# Altium footprint library eLIB.PcbLib: 206 footprints (part 3 of 13)
Each footprint in its own frame and in the unit in brackets; x right, y up, seen from the top. Pads: shape width x height; smd on the part's side, far side on the other; paste and mask are expansions set on the pad; w line width, h text height; cw(c..) or ccw(c..) is an arc to the next point about the centre after c.
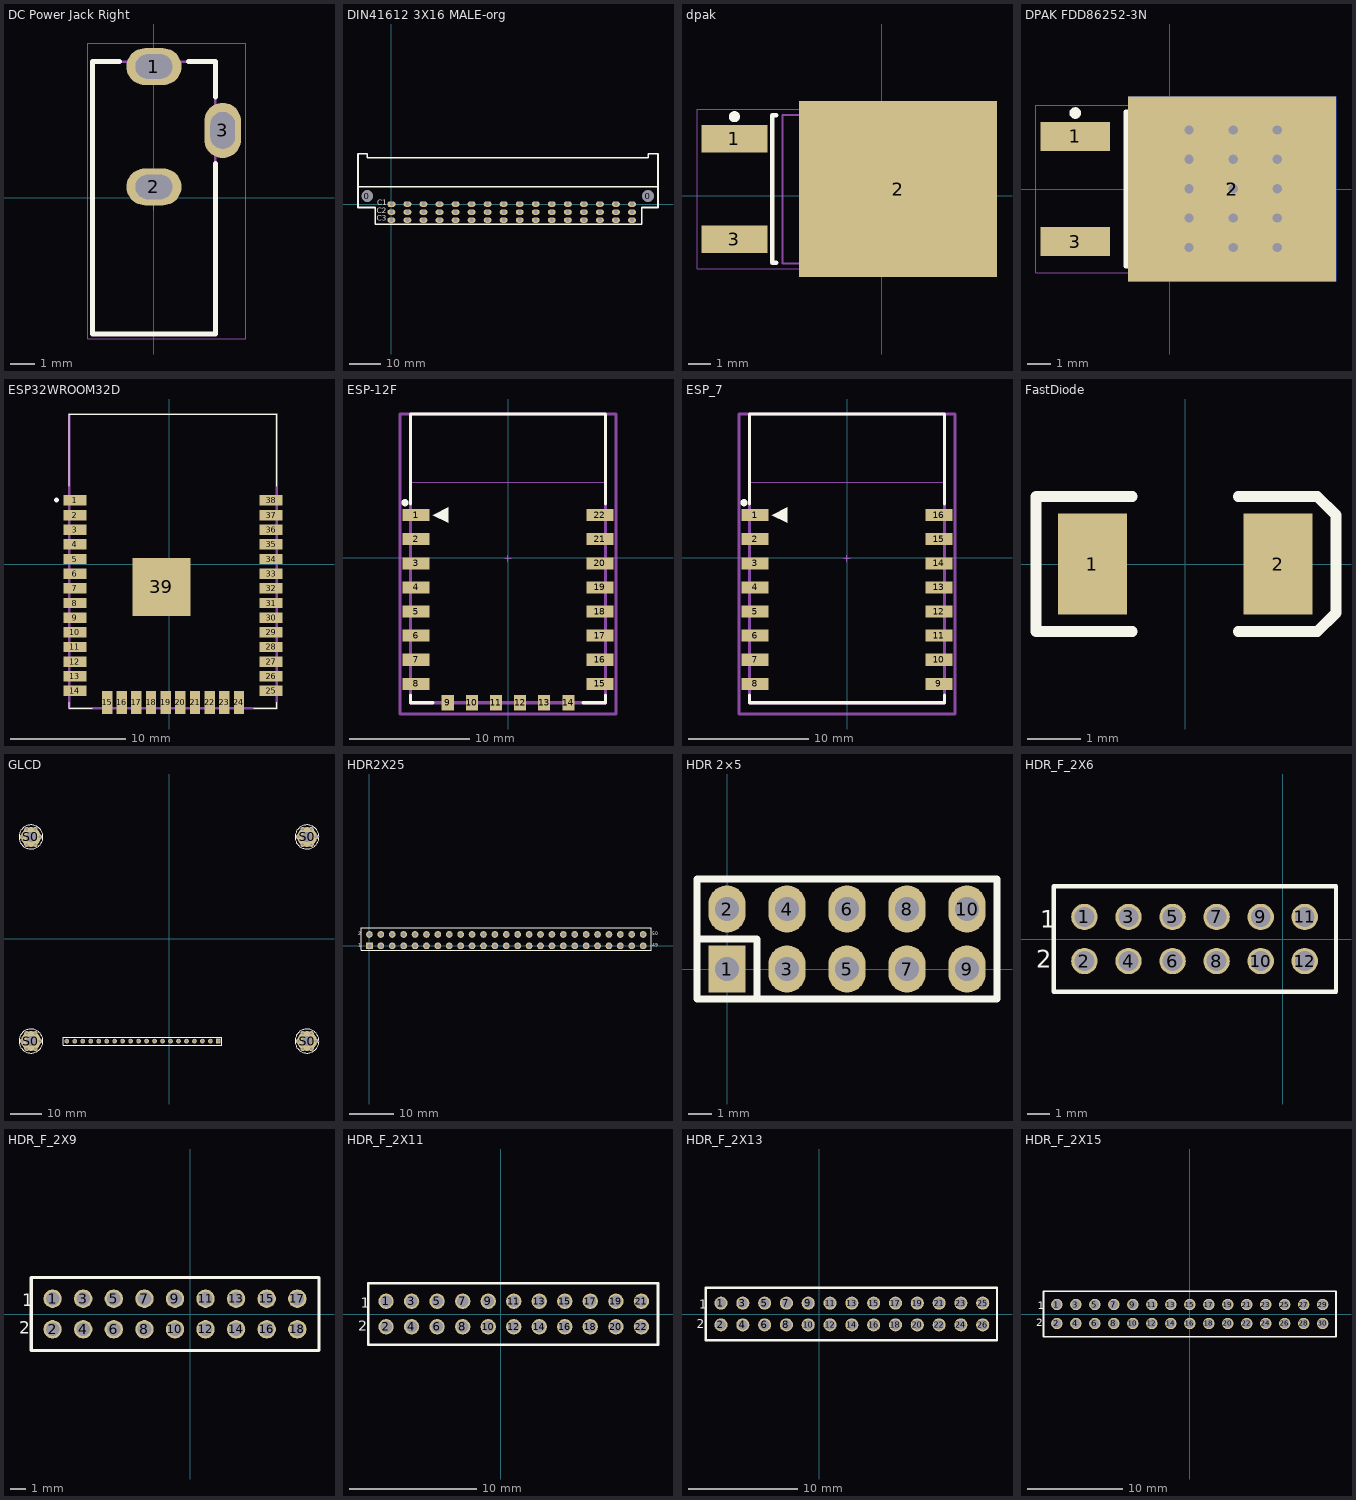
[diagram p2: the footprints below, top view; thin cyan lines are the x and y axes]

## DC Power Jack Right [mm] "DC Power Jack Right Angled(4.2), 694103303002"
height 7.4
pads (3):
  oval 2.25x1.5 hole 1 slot 1.5 at 0 deg: 1(0,5.35) 2(0,0.45)
  oval 1.5x2.25 hole 1 slot 1.5 at 90 deg: 3(2.8,2.75)
Top Overlay:
  lines w0.2: -1.4,5.55 -2.5,5.55 -2.5,-5.55 2.5,-5.55 2.5,1.4 ; 1.4,5.55 2.5,5.55 2.5,4.1
Mechanical 13:
  lines w0.1: -2.5,-5.55 2.5,-5.55 2.5,5.55 -2.5,5.55 -2.5,-5.55
Mechanical 15:
  lines w0.05: -0.5,0 0.5,0 ; 0,-0.5 0,0.5 ; -2.7,-5.75 -2.7,6.3 3.75,6.3 3.75,-5.75 -2.7,-5.75
3D body "694103303002.stp": height 7.8, standoff -2.6, extent -2.5,-5.55 3,5.75

## DIN41612 3X16 MALE-org [mm] "Connector  D032MS-3,0C1-10  9046326921"
height 0.88
pads (50):
  round 3.5 hole 3.7: 0(-7.62,2.54) 0(81.28,2.54)
  oct 2.5x1.7 hole 1.2: 1(0,0)
  oval 2.5x1.7 hole 1.2: 2(5.08,0) 3(10.16,0) 4(15.24,0) 5(20.32,0) 6(25.4,0) 7(30.48,0) 8(35.56,0) 9(40.64,0) 10(45.72,0) 11(50.8,0) 12(55.88,0) 13(60.96,0) 14(66.04,0) 15(71.12,0) 16(76.2,0) 17(0,-2.54) 18(5.08,-2.54) 19(10.16,-2.54) 20(15.24,-2.54) 21(20.32,-2.54) 22(25.4,-2.54) 23(30.48,-2.54) 24(35.56,-2.54) 25(40.64,-2.54) 26(45.72,-2.54) 27(50.8,-2.54) 28(55.88,-2.54) 29(60.96,-2.54) 30(66.04,-2.54) 31(71.12,-2.54) 32(76.2,-2.54) 33(0,-5.08) 34(5.08,-5.08) 35(10.16,-5.08) 36(15.24,-5.08) 37(20.32,-5.08) 38(25.4,-5.08) 39(30.48,-5.08) 40(35.56,-5.08) 41(40.64,-5.08) 42(45.72,-5.08) 43(50.8,-5.08) 44(55.88,-5.08) 45(60.96,-5.08) 46(66.04,-5.08) 47(71.12,-5.08) 48(76.2,-5.08)
Top Overlay:
  lines w0.508: -10.566,1.143 -10.566,15.92 ; -10.566,5.5 84.434,5.5 ; -0.813,-6.357 -5.105,-6.357 ; -0.305,-6.357 79.25,-6.357 79.25,-1.08 84.434,-1.08 84.434,15.92 81.407,15.92 81.407,14.656 -7.595,14.656 -7.595,15.9 -10.566,15.9 -10.566,-1.092 -5.105,-1.092 -5.105,-6.357 ; 0.025,-6.357 -5.105,-6.357 ; 84.434,1.143 84.434,8.643
  text "C3" at -4.572,-5.867 h3
  text "C2" at -4.572,-3.48 h3
  text "C1" at -4.496,-1.067 h3
3D body "DIN41612-C-48-M-RA-1-1.STP": height 11.2, standoff -3.5, extent -10.12,-5.76 83.78,16.24

## dpak [mm] "DPAK"
pads (3):
  rect 3x1.25 smd: 1(-6.7,2.58) 3(-6.7,-1.98)
  rect 9x8 smd: 2(0.737,0.305)
Top Overlay:
  circle w0.25: c-6.7,3.59 r0.125
  lines w0.2: -4.801,-3.048 -4.977,-3.048 -4.977,3.65 -4.801,3.65
Mechanical 13:
  lines w0.1: -4.52,-3.075 1.7,-3.075 1.7,3.675 -4.52,3.675 -4.52,-3.075
Mechanical 15:
  lines w0.05: 3.2,-3.325 -8.4,-3.325 -8.4,3.925 3.2,3.925 ; 3.43,-3.325 3.43,3.925
  lines w0.1: -2.87,0.3 -1.87,0.3 ; -2.37,-0.2 -2.37,0.8
3D body "DPAK228P991X239-3N.step": height 2.84, standoff 0, extent -6.74,-3.075 3.165,3.675

## DPAK FDD86252-3N [mm] "D-PAK, 3-Pads, Body 6.21x6.73mm (max), IPC Medium Density"
height 2.39
pads (4):
  rect 3x1.25 smd: 1(-4.1,2.28) 3(-4.1,-2.28)
  rect 9x8 smd: 2(2.69,0)
  rect 9x8 smd far side: 2(2.69,0)
via 0.83,2.557 diameter 0.8 hole 0.4
via 0.83,1.285 diameter 0.8 hole 0.4
via 0.83,0.012 diameter 0.8 hole 0.4
via 0.83,-1.26 diameter 0.8 hole 0.4
via 0.83,-2.532 diameter 0.8 hole 0.4
via 2.74,-2.532 diameter 0.8 hole 0.4
via 2.74,-1.26 diameter 0.8 hole 0.4
via 2.74,0.012 diameter 0.8 hole 0.4
via 2.74,1.285 diameter 0.8 hole 0.4
via 2.74,2.557 diameter 0.8 hole 0.4
via 4.65,-2.532 diameter 0.8 hole 0.4
via 4.65,-1.26 diameter 0.8 hole 0.4
via 4.65,0.012 diameter 0.8 hole 0.4
via 4.65,1.285 diameter 0.8 hole 0.4
via 4.65,2.557 diameter 0.8 hole 0.4
Top Overlay:
  circle w0.25: c-4.1,3.29 r0.125
  lines w0.2: -1.52,-3.35 -1.92,-3.35 -1.92,3.35 -1.52,3.35
Mechanical 13:
  lines w0.1: -1.92,-3.375 -1.92,3.375 4.3,3.375 4.3,-3.375 -1.92,-3.375
Mechanical 15:
  lines w0.05: 5.8,-3.625 -5.8,-3.625 -5.8,3.625 5.8,3.625 ; 6.03,-3.625 6.03,3.625
  lines w0.1: -0.27,0 0.73,0 ; 0.23,-0.5 0.23,0.5
3D body "DPAK228P991X239-3N.step": height 2.84, standoff 0, extent -4.14,-3.375 5.765,3.375

## ESP32WROOM32D [mm]
pads (39):
  rect 2x0.9 smd: 1(-8.15,5.51) 2(-8.15,4.24) 3(-8.15,2.97) 4(-8.15,1.7) 5(-8.15,0.43) 6(-8.15,-0.84) 7(-8.15,-2.11) 8(-8.15,-3.38) 9(-8.15,-4.65) 10(-8.15,-5.92) 11(-8.15,-7.19) 12(-8.15,-8.46) 13(-8.15,-9.73) 14(-8.15,-11) 25(8.85,-11) 26(8.85,-9.73) 27(8.85,-8.46) 28(8.85,-7.19) 29(8.85,-5.92) 30(8.85,-4.65) 31(8.85,-3.38) 32(8.85,-2.11) 33(8.85,-0.84) 34(8.85,0.43) 35(8.85,1.7) 36(8.85,2.97) 37(8.85,4.24) 38(8.85,5.51)
  rect 0.9x2 smd: 15(-5.365,-12) 16(-4.095,-12) 17(-2.825,-12) 18(-1.555,-12) 19(-0.285,-12) 20(0.985,-12) 21(2.255,-12) 22(3.525,-12) 23(4.795,-12) 24(6.065,-12)
  rect 5x5 smd: 39(-0.65,-1.99)
Top Overlay:
  lines w0.1: -8.65,-12 -8.65,-12.5 -6.65,-12.5 ; -8.65,6.75 -8.65,13 9.35,13 9.35,6.75 ; 7.35,-12.5 9.35,-12.5 9.35,-12
  lines w0.2: -9.75,5.45 ccw(c-9.75,5.55) -9.75,5.65 ccw(c-9.75,5.55) -9.75,5.45
Mechanical 13:
  lines w0.2: -8.65,-12.5 9.35,-12.5 9.35,13 -8.65,13 -8.65,-12.5
3D body "esp wroom 32nnn.STEP": height 3, standoff -0.04, extent -8.65,-12.57 9.42,12.97

## ESP-12F [mm] "ESP-12F WIFI MODULE"
height 3.2
pads (22):
  rect 2.25x1 smd: 1(-7.626,3.556) 2(-7.626,1.556) 3(-7.626,-0.444) 4(-7.626,-2.444) 5(-7.626,-4.444) 6(-7.626,-6.444) 7(-7.626,-8.444) 8(-7.626,-10.444) 15(7.624,-10.444) 16(7.624,-8.444) 17(7.624,-6.444) 18(7.624,-4.444) 19(7.624,-2.444) 20(7.624,-0.444) 21(7.624,1.556) 22(7.624,3.556)
  rect 1x1.25 smd: 9(-5,-12.01) 10(-3,-12.01) 11(-1,-12.01) 12(1,-12.01) 13(3,-12.01) 14(5,-12.01)
Top Layer:
  lines w0.254: -8.083,-12.012 -8.083,-11.36 ; 8.083,-12.012 8.083,-11.36
Top Overlay:
  circle w0.3: c-8.551,4.581 r0.15
  region: -6.231,3.556 -4.961,2.921 -4.961,4.191
  lines w0.254: -8.085,4.472 -8.085,11.927 8.083,11.927 8.083,4.472 ; -6.22,-12.012 -8.083,-12.012 ; 6.22,-12.012 8.083,-12.012 ; -8.083,-12.012 -8.083,-11.36 -8.083,-12.012 ; 8.083,-12.012 8.083,-11.36 8.083,-12.012
Mechanical 13:
  lines w0.051: -8.128,6.283 -8.128,11.938 8.128,11.938 8.128,6.283 -8.128,6.283
  lines w0.254: -8.085,-12.012 8.083,-12.012 8.083,11.927 -8.085,11.927 -8.085,-12.012
Mechanical 15:
  lines w0.1: -0.255,-0.042 0.253,-0.042 ; -0.001,-0.296 -0.001,0.212
  lines w0.254: -8.976,-12.944 -8.976,11.927 8.974,11.927 8.974,-12.944 -8.976,-12.944
3D body "ESP_12_E.STEP": height 2.75, standoff 0.04, extent -8,-11.935 8,12.065

## ESP_7 [mm] "ESP_7"
height 3.2
pads (16):
  rect 2.25x1 smd: 1(-7.626,3.556) 2(-7.626,1.556) 3(-7.626,-0.444) 4(-7.626,-2.444) 5(-7.626,-4.444) 6(-7.626,-6.444) 7(-7.626,-8.444) 8(-7.626,-10.444) 9(7.624,-10.444) 10(7.624,-8.444) 11(7.624,-6.444) 12(7.624,-4.444) 13(7.624,-2.444) 14(7.624,-0.444) 15(7.624,1.556) 16(7.624,3.556)
Top Overlay:
  circle w0.3: c-8.551,4.581 r0.15
  region: -6.231,3.556 -4.961,2.921 -4.961,4.191
  lines w0.254: -8.085,-11.36 -8.085,-12.012 8.083,-12.012 8.083,-11.36 ; -8.085,4.472 -8.085,11.927 8.083,11.927 8.083,4.472
Mechanical 13:
  lines w0.051: -8.128,6.283 -8.128,11.938 8.128,11.938 8.128,6.283 -8.128,6.283
  lines w0.254: -8.085,-12.012 8.083,-12.012 8.083,11.927 -8.085,11.927 -8.085,-12.012
Mechanical 15:
  lines w0.1: -0.255,-0.042 0.253,-0.042 ; -0.001,-0.296 -0.001,0.212
  lines w0.254: -8.976,-12.944 -8.976,11.927 8.974,11.927 8.974,-12.944 -8.976,-12.944
3D body "ESP_12_E.STEP": height 2.75, standoff 0.04, extent -8,-11.935 8,12.065

## FastDiode [mm]
pads (2):
  rect 1.3x1.9 smd: 1(-1.745,0) 2(1.745,0)
Top Overlay:
  lines w0.2: -0.997,-1.27 -2.805,-1.27 -2.805,1.27 -0.997,1.27 ; 0.997,-1.27 2.485,-1.27 2.835,-0.92 2.835,0.92 2.485,1.27 0.997,1.27
3D body "User Library-SOD123-1.STEP": height 1.18, standoff 0, extent -1.957,-0.913 1.943,0.887

## GLCD [mil]
pads (48):
  rect 59.06x59.06 hole 39.37: 1(619,-1279.76)
  round 59.06 hole 39.37: 2(519,-1279.76) 3(419,-1279.76) 4(319,-1279.76) 5(219,-1279.76) 6(119,-1279.76) 7(19,-1279.76) 8(-81,-1279.76) 9(-181,-1279.76) 10(-281,-1279.76) 11(-381,-1279.76) 12(-481,-1279.76) 13(-581,-1279.76) 14(-681,-1279.76) 15(-781,-1279.76) 16(-881,-1279.76) 17(-981,-1279.76) 18(-1081,-1279.76) 19(-1181,-1279.76) 20(-1281,-1279.76)
  round 250 hole 125.98: S0(-1730.32,-1279.53) S0(-1730.32,1279.53) S0(1730.32,-1279.53) S0(1730.32,1279.53)
  round 60 hole 30: S1(-1785.32,-1184.26) S1(-1785.32,1374.79) S1(1675.32,-1184.26) S1(1675.32,1374.79) S2(-1675.32,-1184.26) S2(-1675.32,1374.79) S2(1785.32,-1184.26) S2(1785.32,1374.79) S3(-1620.32,-1279.53) S3(-1620.32,1279.53) S3(1840.32,-1279.53) S3(1840.32,1279.53) S4(-1675.32,-1374.79) S4(-1675.32,1184.26) S4(1785.32,-1374.79) S4(1785.32,1184.26) S5(-1785.32,-1374.79) S5(-1785.32,1184.26) S5(1675.32,-1374.79) S5(1675.32,1184.26) S6(-1840.32,-1279.53) S6(-1840.32,1279.53) S6(1620.32,-1279.53) S6(1620.32,1279.53)
Top Overlay:
  circle w5: c1730.31,1279.53 r150
  circle w5: c1730.31,-1279.53 r150
  circle w5: c-1730.32,-1279.53 r150
  circle w5: c-1730.32,1279.53 r150
  lines w7.87: -1326.32,-1329.76 -1326.32,-1229.76 662.19,-1229.76 662.19,-1329.76 -1326.32,-1329.76
3D body "User Library-GLCD128x64(KS0108).STEP": height 968.5, standoff 472.44, extent -1832.18,-1378.19 1829.23,1377.71

## HDR2X25 [mm] "Connector; Header; 25x2 Position"
pads (50):
  rect 1.5x1.5 hole 0.9: 1(0,0)
  round 1.5 hole 0.9: 2(0,2.54) 3(2.54,0) 4(2.54,2.54) 5(5.08,0) 6(5.08,2.54) 7(7.62,0) 8(7.62,2.54) 9(10.16,0) 10(10.16,2.54) 11(12.7,0) 12(12.7,2.54) 13(15.24,0) 14(15.24,2.54) 15(17.78,0) 16(17.78,2.54) 17(20.32,0) 18(20.32,2.54) 19(22.86,0) 20(22.86,2.54) 21(25.4,0) 22(25.4,2.54) 23(27.94,0) 24(27.94,2.54) 25(30.48,0) 26(30.48,2.54) 27(33.02,0) 28(33.02,2.54) 29(35.56,0) 30(35.56,2.54) 31(38.1,0) 32(38.1,2.54) 33(40.64,0) 34(40.64,2.54) 35(43.18,0) 36(43.18,2.54) 37(45.72,0) 38(45.72,2.54) 39(48.26,0) 40(48.26,2.54) 41(50.8,0) 42(50.8,2.54) 43(53.34,0) 44(53.34,2.54) 45(55.88,0) 46(55.88,2.54) 47(58.42,0) 48(58.42,2.54) 49(60.96,0) 50(60.96,2.54)
Top Overlay:
  lines w0.2: -1.778,-1.016 -1.778,4.064 62.738,4.064 62.738,-1.016 -1.778,-1.016
  text "2" at -2.54,2.032 h1.27
  text "1" at -2.54,-0.508 h1.27
  text "49" at 62.992,-0.508 h1.27
  text "50" at 62.992,2.032 h1.27
3D body "female_header_a-bl200-dg-g20d.stp": height 4, standoff -2.8, extent 41.83,-0.72 62.33,3.78
3D body "female_header_a-bl200-dg-g20d.stp": height 4, standoff -2.8, extent 36.75,-0.72 57.25,3.78
3D body "female_header_a-bl200-dg-g20d.stp": height 4, standoff -2.8, extent 16.43,-0.72 36.93,3.78
3D body "female_header_a-bl200-dg-g20d.stp": height 4, standoff -2.8, extent -1.35,-0.72 19.15,3.78

## HDR 2×5 [mm]
pads (10):
  rect 1.575x2 hole 1: 1(0,0)
  oval 1.575x2 hole 1: 2(0,2.54) 3(2.54,0) 4(2.54,2.54) 5(5.08,0) 6(5.08,2.54) 7(7.62,0) 8(7.62,2.54) 9(10.16,0) 10(10.16,2.54)
Top Overlay:
  lines w0.305: -1.27,1.27 1.27,1.27 1.27,-1.27 ; -1.27,-1.27 11.43,-1.27 11.43,3.81 -1.27,3.81 -1.27,-1.27
3D body "61300411121.stp": height 8.57, standoff -2.97, extent 1.33,-1.3 11.49,1.24
3D body "61300411121.stp": height 8.57, standoff -2.97, extent 1.33,1.24 11.49,3.78
3D body "61300411121.stp": height 8.57, standoff -2.97, extent -1.33,1.3 8.83,3.84
3D body "61300411121.stp": height 8.57, standoff -2.97, extent -1.33,-1.24 8.83,1.3

## HDR_F_2X6 [mm] "Connector; Header; 2mm Pitch"
pads (12):
  round 1.2 / inner round 1.2 / far side oval 1.2x1.6 hole 0.9: 1(-9,1) 2(-9,-1) 3(-7,1) 4(-7,-1) 5(-5,1) 6(-5,-1) 7(-3,1) 8(-3,-1) 9(-1,1) 10(-1,-1) 11(1,1) 12(1,-1)
Top Overlay:
  lines w0.2: -10.4,-2.4 -10.4,2.4 2.42,2.4 2.42,-2.4 -10.4,-2.4
  text "1" at -11,0.5 h0.8
  text "2" at -11.2,-1.3 h0.8
3D body "female_header_a-bl200-dg-g06d.stp": height 4, standoff -2.8, extent -10.23,-2.26 -3.73,2.24
3D body "female_header_a-bl200-dg-g06d.stp": height 4, standoff -2.8, extent -4.26,-2.26 2.24,2.24

## HDR_F_2X9 [mm] "Connector; Header; 2mm Pitch"
pads (18):
  round 1.2 / inner round 1.2 / far side oval 1.2x1.6 hole 0.9: 1(-9,1) 2(-9,-1) 3(-7,1) 4(-7,-1) 5(-5,1) 6(-5,-1) 7(-3,1) 8(-3,-1) 9(-1,1) 10(-1,-1) 11(1,1) 12(1,-1) 13(3,1) 14(3,-1) 15(5,1) 16(5,-1) 17(7,1) 18(7,-1)
Top Overlay:
  lines w0.2: -10.4,-2.4 8.42,-2.4 8.42,2.4 -10.4,2.4 -10.4,-2.4
  text "1" at -11,0.5 h0.8
  text "2" at -11.2,-1.3 h0.8
3D body "female_header_a-bl200-dg-g06d.stp": height 4, standoff -2.8, extent -10.23,-2.26 -3.73,2.24
3D body "female_header_a-bl200-dg-g06d.stp": height 4, standoff -2.8, extent -4.26,-2.26 2.24,2.24
3D body "female_header_a-bl200-dg-g06d.stp": height 4, standoff -2.8, extent 1.77,-2.26 8.27,2.24

## HDR_F_2X11 [mm] "Connector; Header; 2mm Pitch"
pads (22):
  round 1.2 / inner round 1.2 / far side oval 1.2x1.6 hole 0.9: 1(-9,1) 2(-9,-1) 3(-7,1) 4(-7,-1) 5(-5,1) 6(-5,-1) 7(-3,1) 8(-3,-1) 9(-1,1) 10(-1,-1) 11(1,1) 12(1,-1) 13(3,1) 14(3,-1) 15(5,1) 16(5,-1) 17(7,1) 18(7,-1) 19(9,1) 20(9,-1) 21(11,1) 22(11,-1)
Top Overlay:
  lines w0.2: 7.6,-2.4 12.29,-2.4 ; -10.4,-2.4 -10.4,2.4 12.3,2.4 12.3,-2.4 -10.4,-2.4
  text "2" at -11.2,-1.3 h0.8
  text "1" at -11,0.5 h0.8
3D body "female_header_a-bl200-dg-g20d.stp": height 4, standoff -2.8, extent -10.25,-2.25 10.25,2.25
3D body "female_header_a-bl200-dg-g06d.stp": height 4, standoff -2.8, extent 5.69,-2.25 12.19,2.25

## HDR_F_2X13 [mm] "Connector; Header; 2mm Pitch"
pads (26):
  round 1.2 / inner round 1.2 / far side oval 1.2x1.6 hole 0.9: 1(-9,1) 2(-9,-1) 3(-7,1) 4(-7,-1) 5(-5,1) 6(-5,-1) 7(-3,1) 8(-3,-1) 9(-1,1) 10(-1,-1) 11(1,1) 12(1,-1) 13(3,1) 14(3,-1) 15(5,1) 16(5,-1) 17(7,1) 18(7,-1) 19(9,1) 20(9,-1) 21(11,1) 22(11,-1) 23(13,1) 24(13,-1) 25(15,1) 26(15,-1)
Top Overlay:
  lines w0.2: 7.6,-2.4 16.3,-2.4 ; 7.6,2.4 16.31,2.4 ; 16.31,2.4 16.31,-2.4 -10.4,-2.4 -10.4,2.4 16.31,2.4
  text "2" at -11.2,-1.3 h0.8
  text "1" at -11,0.5 h0.8
3D body "female_header_a-bl200-dg-g20d.stp": height 4, standoff -2.8, extent -10.25,-2.25 10.25,2.25
3D body "female_header_a-bl200-dg-g06d.stp": height 4, standoff -2.8, extent 9.67,-2.25 16.17,2.25

## HDR_F_2X15 [mm] "Connector; Header; 2mm Pitch"
pads (30):
  round 1.2 / inner round 1.2 / far side oval 1.2x1.6 hole 0.9: 1(-14,1) 2(-14,-1) 3(-12,1) 4(-12,-1) 5(-10,1) 6(-10,-1) 7(-8,1) 8(-8,-1) 9(-6,1) 10(-6,-1) 11(-4,1) 12(-4,-1) 13(-2,1) 14(-2,-1) 15(0,1) 16(0,-1) 17(2,1) 18(2,-1) 19(4,1) 20(4,-1) 21(6,1) 22(6,-1) 23(8,1) 24(8,-1) 25(10,1) 26(10,-1) 27(12,1) 28(12,-1) 29(14,1) 30(14,-1)
Top Overlay:
  lines w0.2: 0.6,-2.4 15.4,-2.4 15.4,2.4 0.6,2.4 ; 3.42,-2.4 -15.4,-2.4 -15.4,2.4 3.42,2.4
  text "2" at -16.2,-1.3 h0.8
  text "1" at -16,0.5 h0.8
3D body "female_header_a-bl200-dg-g20d.stp": height 4, standoff -2.8, extent -15.25,-2.25 5.25,2.25
3D body "female_header_a-bl200-dg-g06d.stp": height 4, standoff -2.8, extent 4.74,-2.25 11.24,2.25
3D body "female_header_a-bl200-dg-g06d.stp": height 4, standoff -2.8, extent 8.72,-2.25 15.22,2.25